# Altium schematic symbol library Regulator_Linear.SchLib: 1452 symbols (part 6 of 10) (continued)
## MCP1700-1802E_SOT89
designator *  value MCP1700-1802E_SOT89
ki_keywords: regulator linear ldo; ki_description: 250mA Low Quiscent Current LDO, 1.8V output, SOT-89; ki_fp_filters: SOT?89*; Footprint: Package_TO_SOT_SMD:SOT-89-3; Supplier: http://ww1.microchip.com/downloads/en/DeviceDoc/20001826D.pdf
footprint SOT-89-3
pins: 1 GND (power), 2 VI (power), 3 VO (power)

## MCP1700-1802E_TO92
designator *  value MCP1700-1802E_TO92
ki_keywords: regulator linear ldo; ki_description: 250mA Low Quiscent Current LDO, 1.8V output, TO-92; ki_fp_filters: TO?92*; Footprint: Package_TO_SOT_THT:TO-92_Inline; Supplier: http://ww1.microchip.com/downloads/en/DeviceDoc/20001826D.pdf
footprint TO-92_Inline
pins: 1 GND (power), 2 VI (power), 3 VO (power)

## MCP1700-2502E_SOT23
designator *  value MCP1700-2502E_SOT23
ki_keywords: regulator linear ldo; ki_description: 250mA Low Quiscent Current LDO, 2.5V output, SOT-23; ki_fp_filters: SOT?23*; Footprint: Package_TO_SOT_SMD:SOT-23; Supplier: http://ww1.microchip.com/downloads/en/DeviceDoc/20001826D.pdf
footprint SOT-23
pins: 1 GND (power), 2 VO (power), 3 VI (power)

## MCP1700-2502E_SOT89
designator *  value MCP1700-2502E_SOT89
ki_keywords: regulator linear ldo; ki_description: 250mA Low Quiscent Current LDO, 2.5V output, SOT-89; ki_fp_filters: SOT?89*; Footprint: Package_TO_SOT_SMD:SOT-89-3; Supplier: http://ww1.microchip.com/downloads/en/DeviceDoc/20001826D.pdf
footprint SOT-89-3
pins: 1 GND (power), 2 VI (power), 3 VO (power)

## MCP1700-2502E_TO92
designator *  value MCP1700-2502E_TO92
ki_keywords: regulator linear ldo; ki_description: 250mA Low Quiscent Current LDO, 2.5V output, TO-92; ki_fp_filters: TO?92*; Footprint: Package_TO_SOT_THT:TO-92_Inline; Supplier: http://ww1.microchip.com/downloads/en/DeviceDoc/20001826D.pdf
footprint TO-92_Inline
pins: 1 GND (power), 2 VI (power), 3 VO (power)

## MCP1700-2802E_SOT23
designator *  value MCP1700-2802E_SOT23
ki_keywords: regulator linear ldo; ki_description: 250mA Low Quiscent Current LDO, 2.8V output, SOT-23; ki_fp_filters: SOT?23*; Footprint: Package_TO_SOT_SMD:SOT-23; Supplier: http://ww1.microchip.com/downloads/en/DeviceDoc/20001826D.pdf
footprint SOT-23
pins: 1 GND (power), 2 VO (power), 3 VI (power)

## MCP1700-2802E_SOT89
designator *  value MCP1700-2802E_SOT89
ki_keywords: regulator linear ldo; ki_description: 250mA Low Quiscent Current LDO, 2.8V output, SOT-89; ki_fp_filters: SOT?89*; Footprint: Package_TO_SOT_SMD:SOT-89-3; Supplier: http://ww1.microchip.com/downloads/en/DeviceDoc/20001826D.pdf
footprint SOT-89-3
pins: 1 GND (power), 2 VI (power), 3 VO (power)

## MCP1700-2802E_TO92
designator *  value MCP1700-2802E_TO92
ki_keywords: regulator linear ldo; ki_description: 250mA Low Quiscent Current LDO, 2.8V output, TO-92; ki_fp_filters: TO?92*; Footprint: Package_TO_SOT_THT:TO-92_Inline; Supplier: http://ww1.microchip.com/downloads/en/DeviceDoc/20001826D.pdf
footprint TO-92_Inline
pins: 1 GND (power), 2 VI (power), 3 VO (power)

## MCP1700-3002E_SOT23
designator *  value MCP1700-3002E_SOT23
ki_keywords: regulator linear ldo; ki_description: 250mA Low Quiscent Current LDO, 3.0V output, SOT-23; ki_fp_filters: SOT?23*; Footprint: Package_TO_SOT_SMD:SOT-23; Supplier: http://ww1.microchip.com/downloads/en/DeviceDoc/20001826D.pdf
footprint SOT-23
pins: 1 GND (power), 2 VO (power), 3 VI (power)

## MCP1700-3002E_SOT89
designator *  value MCP1700-3002E_SOT89
ki_keywords: regulator linear ldo; ki_description: 250mA Low Quiscent Current LDO, 3.0V output, SOT-89; ki_fp_filters: SOT?89*; Footprint: Package_TO_SOT_SMD:SOT-89-3; Supplier: http://ww1.microchip.com/downloads/en/DeviceDoc/20001826D.pdf
footprint SOT-89-3
pins: 1 GND (power), 2 VI (power), 3 VO (power)

## MCP1700-3002E_TO92
designator *  value MCP1700-3002E_TO92
ki_keywords: regulator linear ldo; ki_description: 250mA Low Quiscent Current LDO, 3.0V output, TO-92; ki_fp_filters: TO?92*; Footprint: Package_TO_SOT_THT:TO-92_Inline; Supplier: http://ww1.microchip.com/downloads/en/DeviceDoc/20001826D.pdf
footprint TO-92_Inline
pins: 1 GND (power), 2 VI (power), 3 VO (power)

## MCP1700-3302E_SOT23
designator *  value MCP1700-3302E_SOT23
ki_keywords: regulator linear ldo; ki_description: 250mA Low Quiscent Current LDO, 3.3V output, SOT-23; ki_fp_filters: SOT?23*; Footprint: Package_TO_SOT_SMD:SOT-23; Supplier: http://ww1.microchip.com/downloads/en/DeviceDoc/20001826D.pdf
footprint SOT-23
pins: 1 GND (power), 2 VO (power), 3 VI (power)

## MCP1700-3302E_SOT89
designator *  value MCP1700-3302E_SOT89
ki_keywords: regulator linear ldo; ki_description: 250mA Low Quiscent Current LDO, 3.3V output, SOT-89; ki_fp_filters: SOT?89*; Footprint: Package_TO_SOT_SMD:SOT-89-3; Supplier: http://ww1.microchip.com/downloads/en/DeviceDoc/20001826D.pdf
footprint SOT-89-3
pins: 1 GND (power), 2 VI (power), 3 VO (power)

## MCP1700-3302E_TO92
designator *  value MCP1700-3302E_TO92
ki_keywords: regulator linear ldo; ki_description: 250mA Low Quiscent Current LDO, 3.3V output, TO-92; ki_fp_filters: TO?92*; Footprint: Package_TO_SOT_THT:TO-92_Inline; Supplier: http://ww1.microchip.com/downloads/en/DeviceDoc/20001826D.pdf
footprint TO-92_Inline
pins: 1 GND (power), 2 VI (power), 3 VO (power)

## MCP1700-5002E_SOT23
designator *  value MCP1700-5002E_SOT23
ki_keywords: regulator linear ldo; ki_description: 250mA Low Quiscent Current LDO, 5.0V output, SOT-23; ki_fp_filters: SOT?23*; Footprint: Package_TO_SOT_SMD:SOT-23; Supplier: http://ww1.microchip.com/downloads/en/DeviceDoc/20001826D.pdf
footprint SOT-23
pins: 1 GND (power), 2 VO (power), 3 VI (power)

## MCP1700-5002E_SOT89
designator *  value MCP1700-5002E_SOT89
ki_keywords: regulator linear ldo; ki_description: 250mA Low Quiscent Current LDO, 5.0V output, SOT-89; ki_fp_filters: SOT?89*; Footprint: Package_TO_SOT_SMD:SOT-89-3; Supplier: http://ww1.microchip.com/downloads/en/DeviceDoc/20001826D.pdf
footprint SOT-89-3
pins: 1 GND (power), 2 VI (power), 3 VO (power)

## MCP1700-5002E_TO92
designator *  value MCP1700-5002E_TO92
ki_keywords: regulator linear ldo; ki_description: 250mA Low Quiscent Current LDO, 5.0V output, TO-92; ki_fp_filters: TO?92*; Footprint: Package_TO_SOT_THT:TO-92_Inline; Supplier: http://ww1.microchip.com/downloads/en/DeviceDoc/20001826D.pdf
footprint TO-92_Inline
pins: 1 GND (power), 2 VI (power), 3 VO (power)

## MCP1703A-1202_SOT23
designator *  value MCP1703A-1202_SOT23
ki_keywords: REGULATOR LDO; ki_description: Low Quiescent Current LDO Regulator, 1.2V, 250mA, Vin<=16V, SOT-23; ki_fp_filters: SOT?23*; Footprint: Package_TO_SOT_SMD:SOT-23; Supplier: http://ww1.microchip.com/downloads/en/DeviceDoc/20005122B.pdf
footprint SOT-23
pins: 1 GND (power), 2 VO (power), 3 VI (power)

## MCP1703A-1202_SOT89
designator *  value MCP1703A-1202_SOT89
ki_keywords: REGULATOR LDO; ki_description: Low Quiescent Current LDO Regulator, 1.2V, 250mA, Vin<=16V, SOT-89; ki_fp_filters: SOT?89*; Footprint: Package_TO_SOT_SMD:SOT-89-3; Supplier: http://ww1.microchip.com/downloads/en/DeviceDoc/20005122B.pdf
footprint SOT-89-3
pins: 1 GND (power), 2 VI (power), 3 VO (power)

## MCP1703A-1202_SOT223
designator *  value MCP1703A-1202_SOT223
ki_keywords: REGULATOR LDO; ki_description: Low Quiescent Current LDO Regulator, 1.2V, 250mA, Vin<=16V, SOT-223; ki_fp_filters: SOT?223*TabPin2*; Footprint: Package_TO_SOT_SMD:SOT-223-3_TabPin2; Supplier: http://ww1.microchip.com/downloads/en/DeviceDoc/20005122B.pdf
footprint SOT-223-3_TabPin2
pins: 1 VI (power), 2 GND (power), 3 VO (power)

## MCP1703A-1502_SOT23
designator *  value MCP1703A-1502_SOT23
ki_keywords: REGULATOR LDO; ki_description: Low Quiescent Current LDO Regulator, 1.5V, 250mA, Vin<=16V, SOT-23; ki_fp_filters: SOT?23*; Footprint: Package_TO_SOT_SMD:SOT-23; Supplier: http://ww1.microchip.com/downloads/en/DeviceDoc/20005122B.pdf
footprint SOT-23
pins: 1 GND (power), 2 VO (power), 3 VI (power)

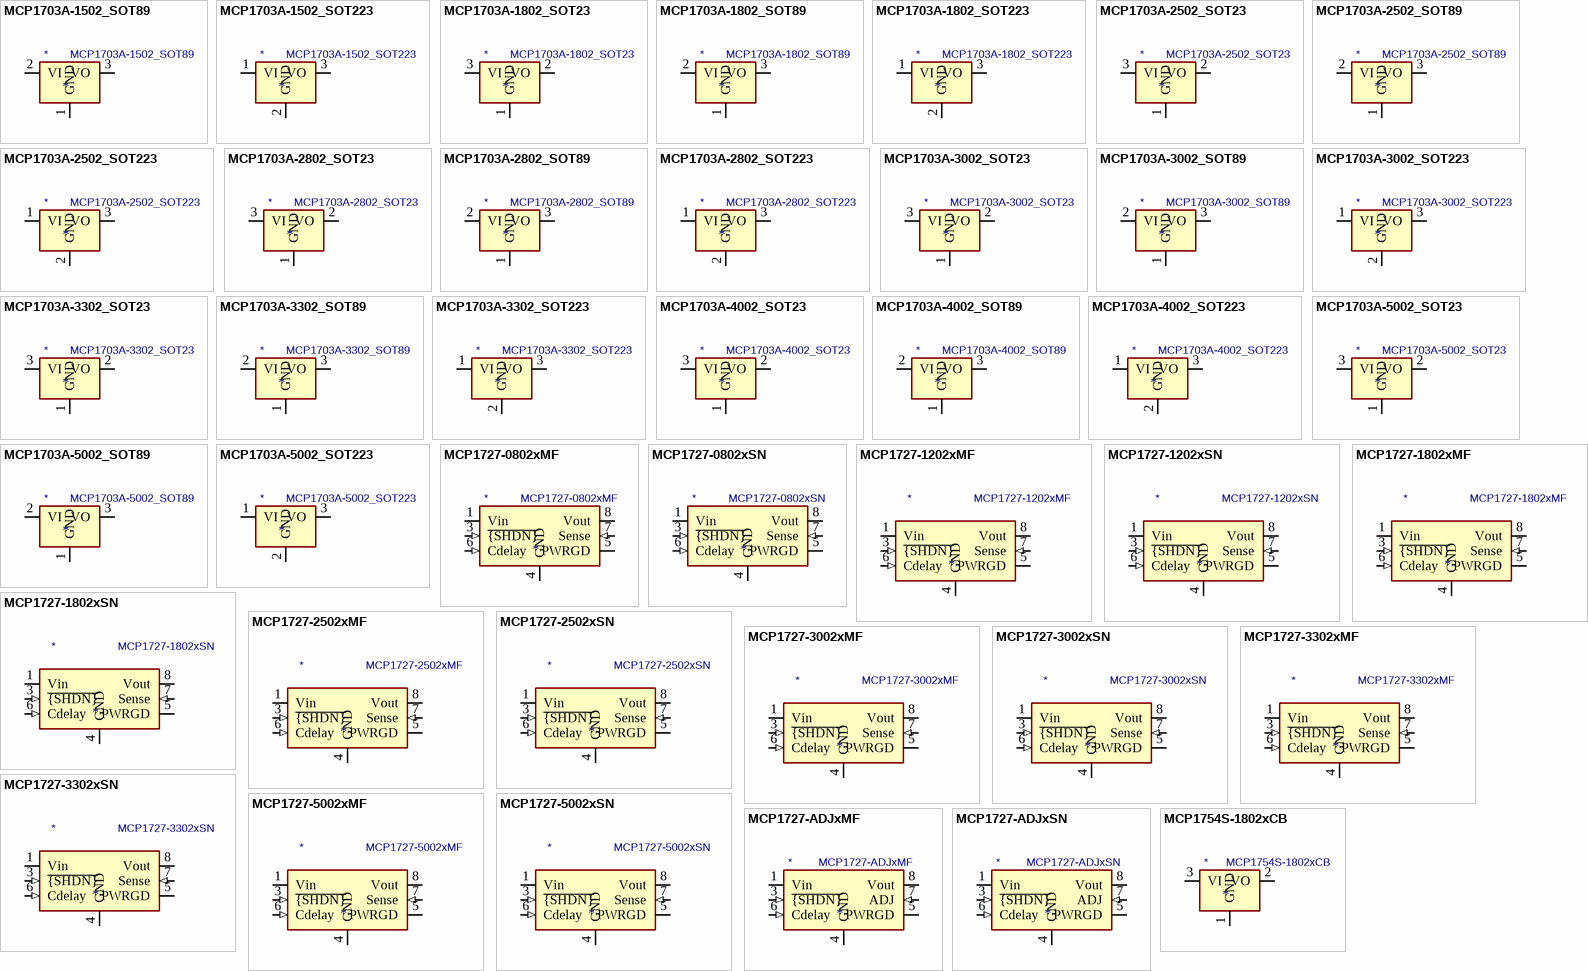
[diagram p22: symbols MCP1703A-1502_SOT89 to MCP1754S-1802xCB]

## MCP1703A-1502_SOT89
designator *  value MCP1703A-1502_SOT89
ki_keywords: REGULATOR LDO; ki_description: Low Quiescent Current LDO Regulator, 1.5V, 250mA, Vin<=16V, SOT-89; ki_fp_filters: SOT?89*; Footprint: Package_TO_SOT_SMD:SOT-89-3; Supplier: http://ww1.microchip.com/downloads/en/DeviceDoc/20005122B.pdf
footprint SOT-89-3
pins: 1 GND (power), 2 VI (power), 3 VO (power)

## MCP1703A-1502_SOT223
designator *  value MCP1703A-1502_SOT223
ki_keywords: REGULATOR LDO; ki_description: Low Quiescent Current LDO Regulator, 1.5V, 250mA, Vin<=16V, SOT-223; ki_fp_filters: SOT?223*TabPin2*; Footprint: Package_TO_SOT_SMD:SOT-223-3_TabPin2; Supplier: http://ww1.microchip.com/downloads/en/DeviceDoc/20005122B.pdf
footprint SOT-223-3_TabPin2
pins: 1 VI (power), 2 GND (power), 3 VO (power)

## MCP1703A-1802_SOT23
designator *  value MCP1703A-1802_SOT23
ki_keywords: REGULATOR LDO; ki_description: Low Quiescent Current LDO Regulator, 1.8V, 250mA, Vin<=16V, SOT-23; ki_fp_filters: SOT?23*; Footprint: Package_TO_SOT_SMD:SOT-23; Supplier: http://ww1.microchip.com/downloads/en/DeviceDoc/20005122B.pdf
footprint SOT-23
pins: 1 GND (power), 2 VO (power), 3 VI (power)

## MCP1703A-1802_SOT89
designator *  value MCP1703A-1802_SOT89
ki_keywords: REGULATOR LDO; ki_description: Low Quiescent Current LDO Regulator, 1.8V, 250mA, Vin<=16V, SOT-89; ki_fp_filters: SOT?89*; Footprint: Package_TO_SOT_SMD:SOT-89-3; Supplier: http://ww1.microchip.com/downloads/en/DeviceDoc/20005122B.pdf
footprint SOT-89-3
pins: 1 GND (power), 2 VI (power), 3 VO (power)

## MCP1703A-1802_SOT223
designator *  value MCP1703A-1802_SOT223
ki_keywords: REGULATOR LDO; ki_description: Low Quiescent Current LDO Regulator, 1.8V, 250mA, Vin<=16V, SOT-223; ki_fp_filters: SOT?223*TabPin2*; Footprint: Package_TO_SOT_SMD:SOT-223-3_TabPin2; Supplier: http://ww1.microchip.com/downloads/en/DeviceDoc/20005122B.pdf
footprint SOT-223-3_TabPin2
pins: 1 VI (power), 2 GND (power), 3 VO (power)

## MCP1703A-2502_SOT23
designator *  value MCP1703A-2502_SOT23
ki_keywords: REGULATOR LDO; ki_description: Low Quiescent Current LDO Regulator, 2.5V, 250mA, Vin<=16V, SOT-23; ki_fp_filters: SOT?23*; Footprint: Package_TO_SOT_SMD:SOT-23; Supplier: http://ww1.microchip.com/downloads/en/DeviceDoc/20005122B.pdf
footprint SOT-23
pins: 1 GND (power), 2 VO (power), 3 VI (power)

## MCP1703A-2502_SOT89
designator *  value MCP1703A-2502_SOT89
ki_keywords: REGULATOR LDO; ki_description: Low Quiescent Current LDO Regulator, 2.5V, 250mA, Vin<=16V, SOT-89; ki_fp_filters: SOT?89*; Footprint: Package_TO_SOT_SMD:SOT-89-3; Supplier: http://ww1.microchip.com/downloads/en/DeviceDoc/20005122B.pdf
footprint SOT-89-3
pins: 1 GND (power), 2 VI (power), 3 VO (power)

## MCP1703A-2502_SOT223
designator *  value MCP1703A-2502_SOT223
ki_keywords: REGULATOR LDO; ki_description: Low Quiescent Current LDO Regulator, 2.5V, 250mA, Vin<=16V, SOT-223; ki_fp_filters: SOT?223*TabPin2*; Footprint: Package_TO_SOT_SMD:SOT-223-3_TabPin2; Supplier: http://ww1.microchip.com/downloads/en/DeviceDoc/20005122B.pdf
footprint SOT-223-3_TabPin2
pins: 1 VI (power), 2 GND (power), 3 VO (power)

## MCP1703A-2802_SOT23
designator *  value MCP1703A-2802_SOT23
ki_keywords: REGULATOR LDO; ki_description: Low Quiescent Current LDO Regulator, 2.8V, 250mA, Vin<=16V, SOT-23; ki_fp_filters: SOT?23*; Footprint: Package_TO_SOT_SMD:SOT-23; Supplier: http://ww1.microchip.com/downloads/en/DeviceDoc/20005122B.pdf
footprint SOT-23
pins: 1 GND (power), 2 VO (power), 3 VI (power)

## MCP1703A-2802_SOT89
designator *  value MCP1703A-2802_SOT89
ki_keywords: REGULATOR LDO; ki_description: Low Quiescent Current LDO Regulator, 2.8V, 250mA, Vin<=16V, SOT-89; ki_fp_filters: SOT?89*; Footprint: Package_TO_SOT_SMD:SOT-89-3; Supplier: http://ww1.microchip.com/downloads/en/DeviceDoc/20005122B.pdf
footprint SOT-89-3
pins: 1 GND (power), 2 VI (power), 3 VO (power)

## MCP1703A-2802_SOT223
designator *  value MCP1703A-2802_SOT223
ki_keywords: REGULATOR LDO; ki_description: Low Quiescent Current LDO Regulator, 2.8V, 250mA, Vin<=16V, SOT-223; ki_fp_filters: SOT?223*TabPin2*; Footprint: Package_TO_SOT_SMD:SOT-223-3_TabPin2; Supplier: http://ww1.microchip.com/downloads/en/DeviceDoc/20005122B.pdf
footprint SOT-223-3_TabPin2
pins: 1 VI (power), 2 GND (power), 3 VO (power)

## MCP1703A-3002_SOT23
designator *  value MCP1703A-3002_SOT23
ki_keywords: REGULATOR LDO; ki_description: Low Quiescent Current LDO Regulator, 3.0V, 250mA, Vin<=16V, SOT-23; ki_fp_filters: SOT?23*; Footprint: Package_TO_SOT_SMD:SOT-23; Supplier: http://ww1.microchip.com/downloads/en/DeviceDoc/20005122B.pdf
footprint SOT-23
pins: 1 GND (power), 2 VO (power), 3 VI (power)

## MCP1703A-3002_SOT89
designator *  value MCP1703A-3002_SOT89
ki_keywords: REGULATOR LDO; ki_description: Low Quiescent Current LDO Regulator, 3.0V, 250mA, Vin<=16V, SOT-89; ki_fp_filters: SOT?89*; Footprint: Package_TO_SOT_SMD:SOT-89-3; Supplier: http://ww1.microchip.com/downloads/en/DeviceDoc/20005122B.pdf
footprint SOT-89-3
pins: 1 GND (power), 2 VI (power), 3 VO (power)

## MCP1703A-3002_SOT223
designator *  value MCP1703A-3002_SOT223
ki_keywords: REGULATOR LDO; ki_description: Low Quiescent Current LDO Regulator, 3.0V, 250mA, Vin<=16V, SOT-223; ki_fp_filters: SOT?223*TabPin2*; Footprint: Package_TO_SOT_SMD:SOT-223-3_TabPin2; Supplier: http://ww1.microchip.com/downloads/en/DeviceDoc/20005122B.pdf
footprint SOT-223-3_TabPin2
pins: 1 VI (power), 2 GND (power), 3 VO (power)

## MCP1703A-3302_SOT23
designator *  value MCP1703A-3302_SOT23
ki_keywords: REGULATOR LDO; ki_description: Low Quiescent Current LDO Regulator, 3.3V, 250mA, Vin<=16V, SOT-23; ki_fp_filters: SOT?23*; Footprint: Package_TO_SOT_SMD:SOT-23; Supplier: http://ww1.microchip.com/downloads/en/DeviceDoc/20005122B.pdf
footprint SOT-23
pins: 1 GND (power), 2 VO (power), 3 VI (power)

## MCP1703A-3302_SOT89
designator *  value MCP1703A-3302_SOT89
ki_keywords: REGULATOR LDO; ki_description: Low Quiescent Current LDO Regulator, 3.3V, 250mA, Vin<=16V, SOT-89; ki_fp_filters: SOT?89*; Footprint: Package_TO_SOT_SMD:SOT-89-3; Supplier: http://ww1.microchip.com/downloads/en/DeviceDoc/20005122B.pdf
footprint SOT-89-3
pins: 1 GND (power), 2 VI (power), 3 VO (power)

## MCP1703A-3302_SOT223
designator *  value MCP1703A-3302_SOT223
ki_keywords: REGULATOR LDO; ki_description: Low Quiescent Current LDO Regulator, 3.3V, 250mA, Vin<=16V, SOT-223; ki_fp_filters: SOT?223*TabPin2*; Footprint: Package_TO_SOT_SMD:SOT-223-3_TabPin2; Supplier: http://ww1.microchip.com/downloads/en/DeviceDoc/20005122B.pdf
footprint SOT-223-3_TabPin2
pins: 1 VI (power), 2 GND (power), 3 VO (power)

## MCP1703A-4002_SOT23
designator *  value MCP1703A-4002_SOT23
ki_keywords: REGULATOR LDO; ki_description: Low Quiescent Current LDO Regulator, 4.0V, 250mA, Vin<=16V, SOT-23; ki_fp_filters: SOT?23*; Footprint: Package_TO_SOT_SMD:SOT-23; Supplier: http://ww1.microchip.com/downloads/en/DeviceDoc/20005122B.pdf
footprint SOT-23
pins: 1 GND (power), 2 VO (power), 3 VI (power)

## MCP1703A-4002_SOT89
designator *  value MCP1703A-4002_SOT89
ki_keywords: REGULATOR LDO; ki_description: Low Quiescent Current LDO Regulator, 4.0V, 250mA, Vin<=16V, SOT-89; ki_fp_filters: SOT?89*; Footprint: Package_TO_SOT_SMD:SOT-89-3; Supplier: http://ww1.microchip.com/downloads/en/DeviceDoc/20005122B.pdf
footprint SOT-89-3
pins: 1 GND (power), 2 VI (power), 3 VO (power)

## MCP1703A-4002_SOT223
designator *  value MCP1703A-4002_SOT223
ki_keywords: REGULATOR LDO; ki_description: Low Quiescent Current LDO Regulator, 4.0V, 250mA, Vin<=16V, SOT-223; ki_fp_filters: SOT?223*TabPin2*; Footprint: Package_TO_SOT_SMD:SOT-223-3_TabPin2; Supplier: http://ww1.microchip.com/downloads/en/DeviceDoc/20005122B.pdf
footprint SOT-223-3_TabPin2
pins: 1 VI (power), 2 GND (power), 3 VO (power)

## MCP1703A-5002_SOT23
designator *  value MCP1703A-5002_SOT23
ki_keywords: REGULATOR LDO; ki_description: Low Quiescent Current LDO Regulator, 5.0V, 250mA, Vin<=16V, SOT-23; ki_fp_filters: SOT?23*; Footprint: Package_TO_SOT_SMD:SOT-23; Supplier: http://ww1.microchip.com/downloads/en/DeviceDoc/20005122B.pdf
footprint SOT-23
pins: 1 GND (power), 2 VO (power), 3 VI (power)

## MCP1703A-5002_SOT89
designator *  value MCP1703A-5002_SOT89
ki_keywords: REGULATOR LDO; ki_description: Low Quiescent Current LDO Regulator, 5.0V, 250mA, Vin<=16V, SOT-89; ki_fp_filters: SOT?89*; Footprint: Package_TO_SOT_SMD:SOT-89-3; Supplier: http://ww1.microchip.com/downloads/en/DeviceDoc/20005122B.pdf
footprint SOT-89-3
pins: 1 GND (power), 2 VI (power), 3 VO (power)

## MCP1703A-5002_SOT223
designator *  value MCP1703A-5002_SOT223
ki_keywords: REGULATOR LDO; ki_description: Low Quiescent Current LDO Regulator, 5.0V, 250mA, Vin<=16V, SOT-223; ki_fp_filters: SOT?223*TabPin2*; Footprint: Package_TO_SOT_SMD:SOT-223-3_TabPin2; Supplier: http://ww1.microchip.com/downloads/en/DeviceDoc/20005122B.pdf
footprint SOT-223-3_TabPin2
pins: 1 VI (power), 2 GND (power), 3 VO (power)

## MCP1727-0802xMF
designator *  value MCP1727-0802xMF
ki_keywords: Low Voltage Low Quiescent Current Fixed LDO Regulator; ki_description: 1.5A, Low Voltage, Low Quiescent Current LDO Regulator, 2.3 - 6V Input, Fixed 0.8V Output, 330mV Dropout, DFN-8; ki_fp_filters: DFN*3x3mm*P0.65mm*; Footprint: Package_DFN_QFN:DFN-8-1EP_3x3mm_P0.65mm_EP1.55x2.4mm; Supplier: https://ww1.microchip.com/downloads/aemtest/APID/ProductDocuments/DataSheets/MCP1727-1.5A-Low-Voltage-Low-Quiescent-Current-LDO-Regulator-20001999D.pdf
footprint DFN-8-1EP_3x3mm_P0.65mm_EP1.55x2.4mm
pins: 1 Vin (power), 2 Vin hidden, 3 ~{{SHDN}} (in), 4 GND (power), 5 PWRGD (oc), 6 Cdelay (in), 7 Sense (in), 8 Vout (power), 9 GND hidden

## MCP1727-0802xSN
designator *  value MCP1727-0802xSN
ki_keywords: Low Voltage Low Quiescent Current Fixed LDO Regulator; ki_description: 1.5A, Low Voltage, Low Quiescent Current LDO Regulator, 2.3 - 6V Input, Fixed 0.8V Output, 330mV Dropout, SOIC-8; ki_fp_filters: SOIC*3.9x4.9mm*P1.27mm*; Footprint: Package_SO:SOIC-8_3.9x4.9mm_P1.27mm; Supplier: https://ww1.microchip.com/downloads/aemtest/APID/ProductDocuments/DataSheets/MCP1727-1.5A-Low-Voltage-Low-Quiescent-Current-LDO-Regulator-20001999D.pdf
footprint SOIC-8_3.9x4.9mm_P1.27mm
pins: 1 Vin (power), 2 Vin hidden, 3 ~{{SHDN}} (in), 4 GND (power), 5 PWRGD (oc), 6 Cdelay (in), 7 Sense (in), 8 Vout (power)

## MCP1727-1202xMF
designator *  value MCP1727-1202xMF
ki_keywords: Low Voltage Low Quiescent Current Fixed LDO Regulator; ki_description: 1.5A, Low Voltage, Low Quiescent Current LDO Regulator, 2.3 - 6V Input, Fixed 1.2V Output, 330mV Dropout, DFN-8; ki_fp_filters: DFN*3x3mm*P0.65mm*; Footprint: Package_DFN_QFN:DFN-8-1EP_3x3mm_P0.65mm_EP1.55x2.4mm; Supplier: https://ww1.microchip.com/downloads/aemtest/APID/ProductDocuments/DataSheets/MCP1727-1.5A-Low-Voltage-Low-Quiescent-Current-LDO-Regulator-20001999D.pdf
footprint DFN-8-1EP_3x3mm_P0.65mm_EP1.55x2.4mm
pins: 1 Vin (power), 2 Vin hidden, 3 ~{{SHDN}} (in), 4 GND (power), 5 PWRGD (oc), 6 Cdelay (in), 7 Sense (in), 8 Vout (power), 9 GND hidden

## MCP1727-1202xSN
designator *  value MCP1727-1202xSN
ki_keywords: Low Voltage Low Quiescent Current Fixed LDO Regulator; ki_description: 1.5A, Low Voltage, Low Quiescent Current LDO Regulator, 2.3 - 6V Input, Fixed 1.2V Output, 330mV Dropout, SOIC-8; ki_fp_filters: SOIC*3.9x4.9mm*P1.27mm*; Footprint: Package_SO:SOIC-8_3.9x4.9mm_P1.27mm; Supplier: https://ww1.microchip.com/downloads/aemtest/APID/ProductDocuments/DataSheets/MCP1727-1.5A-Low-Voltage-Low-Quiescent-Current-LDO-Regulator-20001999D.pdf
footprint SOIC-8_3.9x4.9mm_P1.27mm
pins: 1 Vin (power), 2 Vin hidden, 3 ~{{SHDN}} (in), 4 GND (power), 5 PWRGD (oc), 6 Cdelay (in), 7 Sense (in), 8 Vout (power)

## MCP1727-1802xMF
designator *  value MCP1727-1802xMF
ki_keywords: Low Voltage Low Quiescent Current Fixed LDO Regulator; ki_description: 1.5A, Low Voltage, Low Quiescent Current LDO Regulator, 2.3 - 6V Input, Fixed 1.8V Output, 330mV Dropout, DFN-8; ki_fp_filters: DFN*3x3mm*P0.65mm*; Footprint: Package_DFN_QFN:DFN-8-1EP_3x3mm_P0.65mm_EP1.55x2.4mm; Supplier: https://ww1.microchip.com/downloads/aemtest/APID/ProductDocuments/DataSheets/MCP1727-1.5A-Low-Voltage-Low-Quiescent-Current-LDO-Regulator-20001999D.pdf
footprint DFN-8-1EP_3x3mm_P0.65mm_EP1.55x2.4mm
pins: 1 Vin (power), 2 Vin hidden, 3 ~{{SHDN}} (in), 4 GND (power), 5 PWRGD (oc), 6 Cdelay (in), 7 Sense (in), 8 Vout (power), 9 GND hidden

## MCP1727-1802xSN
designator *  value MCP1727-1802xSN
ki_keywords: Low Voltage Low Quiescent Current Fixed LDO Regulator; ki_description: 1.5A, Low Voltage, Low Quiescent Current LDO Regulator, 2.3 - 6V Input, Fixed 1.8V Output, 330mV Dropout, SOIC-8; ki_fp_filters: SOIC*3.9x4.9mm*P1.27mm*; Footprint: Package_SO:SOIC-8_3.9x4.9mm_P1.27mm; Supplier: https://ww1.microchip.com/downloads/aemtest/APID/ProductDocuments/DataSheets/MCP1727-1.5A-Low-Voltage-Low-Quiescent-Current-LDO-Regulator-20001999D.pdf
footprint SOIC-8_3.9x4.9mm_P1.27mm
pins: 1 Vin (power), 2 Vin hidden, 3 ~{{SHDN}} (in), 4 GND (power), 5 PWRGD (oc), 6 Cdelay (in), 7 Sense (in), 8 Vout (power)

## MCP1727-2502xMF
designator *  value MCP1727-2502xMF
ki_keywords: Low Voltage Low Quiescent Current Fixed LDO Regulator; ki_description: 1.5A, Low Voltage, Low Quiescent Current LDO Regulator, 2.3 - 6V Input, Fixed 2.5V Output, 330mV Dropout, DFN-8; ki_fp_filters: DFN*3x3mm*P0.65mm*; Footprint: Package_DFN_QFN:DFN-8-1EP_3x3mm_P0.65mm_EP1.55x2.4mm; Supplier: https://ww1.microchip.com/downloads/aemtest/APID/ProductDocuments/DataSheets/MCP1727-1.5A-Low-Voltage-Low-Quiescent-Current-LDO-Regulator-20001999D.pdf
footprint DFN-8-1EP_3x3mm_P0.65mm_EP1.55x2.4mm
pins: 1 Vin (power), 2 Vin hidden, 3 ~{{SHDN}} (in), 4 GND (power), 5 PWRGD (oc), 6 Cdelay (in), 7 Sense (in), 8 Vout (power), 9 GND hidden

## MCP1727-2502xSN
designator *  value MCP1727-2502xSN
ki_keywords: Low Voltage Low Quiescent Current Fixed LDO Regulator; ki_description: 1.5A, Low Voltage, Low Quiescent Current LDO Regulator, 2.3 - 6V Input, Fixed 2.5V Output, 330mV Dropout, SOIC-8; ki_fp_filters: SOIC*3.9x4.9mm*P1.27mm*; Footprint: Package_SO:SOIC-8_3.9x4.9mm_P1.27mm; Supplier: https://ww1.microchip.com/downloads/aemtest/APID/ProductDocuments/DataSheets/MCP1727-1.5A-Low-Voltage-Low-Quiescent-Current-LDO-Regulator-20001999D.pdf
footprint SOIC-8_3.9x4.9mm_P1.27mm
pins: 1 Vin (power), 2 Vin hidden, 3 ~{{SHDN}} (in), 4 GND (power), 5 PWRGD (oc), 6 Cdelay (in), 7 Sense (in), 8 Vout (power)

## MCP1727-3002xMF
designator *  value MCP1727-3002xMF
ki_keywords: Low Voltage Low Quiescent Current Fixed LDO Regulator; ki_description: 1.5A, Low Voltage, Low Quiescent Current LDO Regulator, 2.3 - 6V Input, Fixed 3.0V Output, 330mV Dropout, DFN-8; ki_fp_filters: DFN*3x3mm*P0.65mm*; Footprint: Package_DFN_QFN:DFN-8-1EP_3x3mm_P0.65mm_EP1.55x2.4mm; Supplier: https://ww1.microchip.com/downloads/aemtest/APID/ProductDocuments/DataSheets/MCP1727-1.5A-Low-Voltage-Low-Quiescent-Current-LDO-Regulator-20001999D.pdf
footprint DFN-8-1EP_3x3mm_P0.65mm_EP1.55x2.4mm
pins: 1 Vin (power), 2 Vin hidden, 3 ~{{SHDN}} (in), 4 GND (power), 5 PWRGD (oc), 6 Cdelay (in), 7 Sense (in), 8 Vout (power), 9 GND hidden

## MCP1727-3002xSN
designator *  value MCP1727-3002xSN
ki_keywords: Low Voltage Low Quiescent Current Fixed LDO Regulator; ki_description: 1.5A, Low Voltage, Low Quiescent Current LDO Regulator, 2.3 - 6V Input, Fixed 3.0V Output, 330mV Dropout, SOIC-8; ki_fp_filters: SOIC*3.9x4.9mm*P1.27mm*; Footprint: Package_SO:SOIC-8_3.9x4.9mm_P1.27mm; Supplier: https://ww1.microchip.com/downloads/aemtest/APID/ProductDocuments/DataSheets/MCP1727-1.5A-Low-Voltage-Low-Quiescent-Current-LDO-Regulator-20001999D.pdf
footprint SOIC-8_3.9x4.9mm_P1.27mm
pins: 1 Vin (power), 2 Vin hidden, 3 ~{{SHDN}} (in), 4 GND (power), 5 PWRGD (oc), 6 Cdelay (in), 7 Sense (in), 8 Vout (power)

## MCP1727-3302xMF
designator *  value MCP1727-3302xMF
ki_keywords: Low Voltage Low Quiescent Current Fixed LDO Regulator; ki_description: 1.5A, Low Voltage, Low Quiescent Current LDO Regulator, 2.3 - 6V Input, Fixed 3.3V Output, 330mV Dropout, DFN-8; ki_fp_filters: DFN*3x3mm*P0.65mm*; Footprint: Package_DFN_QFN:DFN-8-1EP_3x3mm_P0.65mm_EP1.55x2.4mm; Supplier: https://ww1.microchip.com/downloads/aemtest/APID/ProductDocuments/DataSheets/MCP1727-1.5A-Low-Voltage-Low-Quiescent-Current-LDO-Regulator-20001999D.pdf
footprint DFN-8-1EP_3x3mm_P0.65mm_EP1.55x2.4mm
pins: 1 Vin (power), 2 Vin hidden, 3 ~{{SHDN}} (in), 4 GND (power), 5 PWRGD (oc), 6 Cdelay (in), 7 Sense (in), 8 Vout (power), 9 GND hidden

## MCP1727-3302xSN
designator *  value MCP1727-3302xSN
ki_keywords: Low Voltage Low Quiescent Current Fixed LDO Regulator; ki_description: 1.5A, Low Voltage, Low Quiescent Current LDO Regulator, 2.3 - 6V Input, Fixed 3.3V Output, 330mV Dropout, SOIC-8; ki_fp_filters: SOIC*3.9x4.9mm*P1.27mm*; Footprint: Package_SO:SOIC-8_3.9x4.9mm_P1.27mm; Supplier: https://ww1.microchip.com/downloads/aemtest/APID/ProductDocuments/DataSheets/MCP1727-1.5A-Low-Voltage-Low-Quiescent-Current-LDO-Regulator-20001999D.pdf
footprint SOIC-8_3.9x4.9mm_P1.27mm
pins: 1 Vin (power), 2 Vin hidden, 3 ~{{SHDN}} (in), 4 GND (power), 5 PWRGD (oc), 6 Cdelay (in), 7 Sense (in), 8 Vout (power)

## MCP1727-5002xMF
designator *  value MCP1727-5002xMF
ki_keywords: Low Voltage Low Quiescent Current Fixed LDO Regulator; ki_description: 1.5A, Low Voltage, Low Quiescent Current LDO Regulator, 2.3 - 6V Input, Fixed 5.0V Output, 330mV Dropout, DFN-8; ki_fp_filters: DFN*3x3mm*P0.65mm*; Footprint: Package_DFN_QFN:DFN-8-1EP_3x3mm_P0.65mm_EP1.55x2.4mm; Supplier: https://ww1.microchip.com/downloads/aemtest/APID/ProductDocuments/DataSheets/MCP1727-1.5A-Low-Voltage-Low-Quiescent-Current-LDO-Regulator-20001999D.pdf
footprint DFN-8-1EP_3x3mm_P0.65mm_EP1.55x2.4mm
pins: 1 Vin (power), 2 Vin hidden, 3 ~{{SHDN}} (in), 4 GND (power), 5 PWRGD (oc), 6 Cdelay (in), 7 Sense (in), 8 Vout (power), 9 GND hidden

## MCP1727-5002xSN
designator *  value MCP1727-5002xSN
ki_keywords: Low Voltage Low Quiescent Current Fixed LDO Regulator; ki_description: 1.5A, Low Voltage, Low Quiescent Current LDO Regulator, 2.3 - 6V Input, Fixed 5.0V Output, 330mV Dropout, SOIC-8; ki_fp_filters: SOIC*3.9x4.9mm*P1.27mm*; Footprint: Package_SO:SOIC-8_3.9x4.9mm_P1.27mm; Supplier: https://ww1.microchip.com/downloads/aemtest/APID/ProductDocuments/DataSheets/MCP1727-1.5A-Low-Voltage-Low-Quiescent-Current-LDO-Regulator-20001999D.pdf
footprint SOIC-8_3.9x4.9mm_P1.27mm
pins: 1 Vin (power), 2 Vin hidden, 3 ~{{SHDN}} (in), 4 GND (power), 5 PWRGD (oc), 6 Cdelay (in), 7 Sense (in), 8 Vout (power)

## MCP1727-ADJxMF
designator *  value MCP1727-ADJxMF
ki_keywords: Low Voltage Low Quiescent Current Adjustable LDO Regulator; ki_description: 1.5A, Low Voltage, Low Quiescent Current LDO Regulator, 2.3 - 6V Input, Adjustable Output, 330mV Dropout, DFN-8; ki_fp_filters: DFN*3x3mm*P0.65mm*; Footprint: Package_DFN_QFN:DFN-8-1EP_3x3mm_P0.65mm_EP1.55x2.4mm; Supplier: https://ww1.microchip.com/downloads/aemtest/APID/ProductDocuments/DataSheets/MCP1727-1.5A-Low-Voltage-Low-Quiescent-Current-LDO-Regulator-20001999D.pdf
footprint DFN-8-1EP_3x3mm_P0.65mm_EP1.55x2.4mm
pins: 1 Vin (power), 2 Vin hidden, 3 ~{{SHDN}} (in), 4 GND (power), 5 PWRGD (oc), 6 Cdelay (in), 7 ADJ (in), 8 Vout (power), 9 GND hidden

## MCP1727-ADJxSN
designator *  value MCP1727-ADJxSN
ki_keywords: Low Voltage Low Quiescent Current Adjustable LDO Regulator; ki_description: 1.5A, Low Voltage, Low Quiescent Current LDO Regulator, 2.3 - 6V Input, Adjustable Output, 330mV Dropout, SOIC-8; ki_fp_filters: SOIC*3.9x4.9mm*P1.27mm*; Footprint: Package_SO:SOIC-8_3.9x4.9mm_P1.27mm; Supplier: https://ww1.microchip.com/downloads/aemtest/APID/ProductDocuments/DataSheets/MCP1727-1.5A-Low-Voltage-Low-Quiescent-Current-LDO-Regulator-20001999D.pdf
footprint SOIC-8_3.9x4.9mm_P1.27mm
pins: 1 Vin (power), 2 Vin hidden, 3 ~{{SHDN}} (in), 4 GND (power), 5 PWRGD (oc), 6 Cdelay (in), 7 ADJ (in), 8 Vout (power)

## MCP1754S-1802xCB
designator *  value MCP1754S-1802xCB
ki_keywords: Regulator LDO; ki_description: Fixed 150mA Low Dropout Voltage Regulator, Positive, 1.8V output, SOT-23; ki_fp_filters: SOT?23*; Footprint: Package_TO_SOT_SMD:SOT-23; Supplier: http://ww1.microchip.com/downloads/en/DeviceDoc/20002276C.pdf
footprint SOT-23
pins: 1 GND (power), 2 VO (power), 3 VI (power)

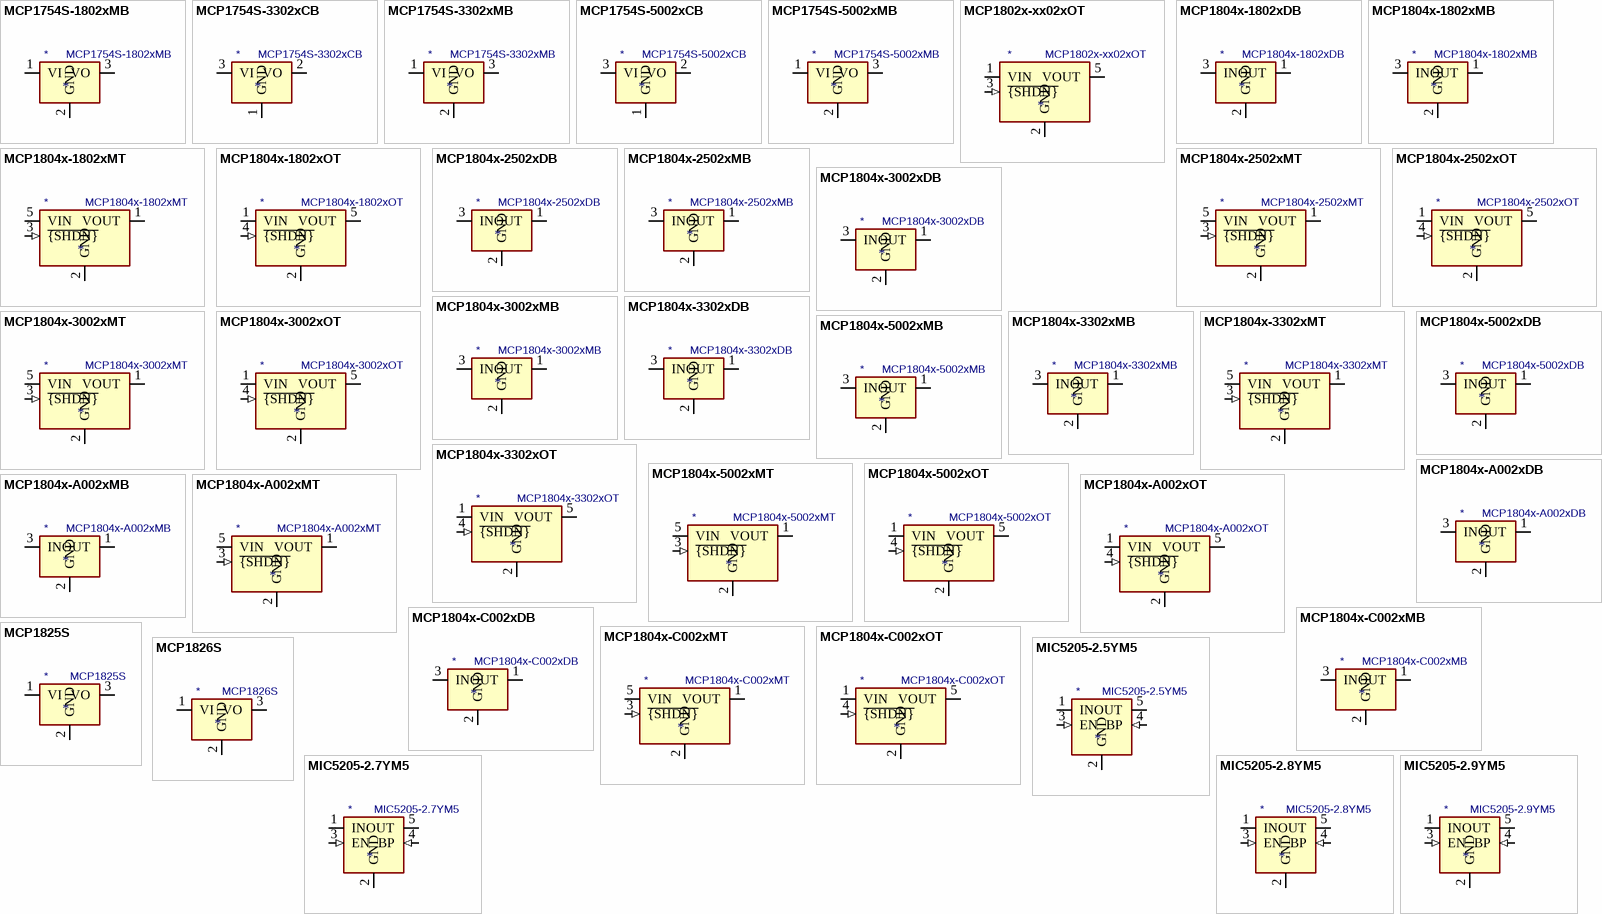
[diagram p23: symbols MCP1754S-1802xMB to MIC5205-2.9YM5]

## MCP1754S-1802xMB
designator *  value MCP1754S-1802xMB
ki_keywords: Regulator LDO; ki_description: Fixed 150mA Low Dropout Voltage Regulator, Positive, 1.8V output, SOT-89; ki_fp_filters: SOT?89*; Footprint: Package_TO_SOT_SMD:SOT-89-3; Supplier: http://ww1.microchip.com/downloads/en/DeviceDoc/20002276C.pdf
footprint SOT-89-3
pins: 1 VI (power), 2 GND (power), 3 VO (power)

## MCP1754S-3302xCB
designator *  value MCP1754S-3302xCB
ki_keywords: Regulator LDO; ki_description: Fixed 150mA Low Dropout Voltage Regulator, Positive, 3.3V output, SOT-23; ki_fp_filters: SOT?23*; Footprint: Package_TO_SOT_SMD:SOT-23; Supplier: http://ww1.microchip.com/downloads/en/DeviceDoc/20002276C.pdf
footprint SOT-23
pins: 1 GND (power), 2 VO (power), 3 VI (power)

## MCP1754S-3302xMB
designator *  value MCP1754S-3302xMB
ki_keywords: Regulator LDO; ki_description: Fixed 150mA Low Dropout Voltage Regulator, Positive, 3.3V output, SOT-89; ki_fp_filters: SOT?89*; Footprint: Package_TO_SOT_SMD:SOT-89-3; Supplier: http://ww1.microchip.com/downloads/en/DeviceDoc/20002276C.pdf
footprint SOT-89-3
pins: 1 VI (power), 2 GND (power), 3 VO (power)

## MCP1754S-5002xCB
designator *  value MCP1754S-5002xCB
ki_keywords: Regulator LDO; ki_description: Fixed 150mA Low Dropout Voltage Regulator, Positive, 5V output, SOT-23; ki_fp_filters: SOT?23*; Footprint: Package_TO_SOT_SMD:SOT-23; Supplier: http://ww1.microchip.com/downloads/en/DeviceDoc/20002276C.pdf
footprint SOT-23
pins: 1 GND (power), 2 VO (power), 3 VI (power)

## MCP1754S-5002xMB
designator *  value MCP1754S-5002xMB
ki_keywords: Regulator LDO; ki_description: Fixed 150mA Low Dropout Voltage Regulator, Positive, 5V output, SOT-89; ki_fp_filters: SOT?89*; Footprint: Package_TO_SOT_SMD:SOT-89-3; Supplier: http://ww1.microchip.com/downloads/en/DeviceDoc/20002276C.pdf
footprint SOT-89-3
pins: 1 VI (power), 2 GND (power), 3 VO (power)

## MCP1802x-xx02xOT
designator *  value MCP1802x-xx02xOT
ki_keywords: LDO Linear Voltage Regulator; ki_description: 150mA, Tiny CMOS LDO With Shutdown, Fixed Voltage, SOT-23-5; ki_fp_filters: SOT?23*; Footprint: Package_TO_SOT_SMD:SOT-23-5; Supplier: http://ww1.microchip.com/downloads/en/DeviceDoc/22053C.pdf
footprint SOT-23-5
pins: 1 VIN (power), 2 GND (power), 3 ~{{SHDN}} (in), 4 NC (in) hidden, 5 VOUT (power)

## MCP1804x-1802xDB
designator *  value MCP1804x-1802xDB
ki_keywords: linear regulator ldo fixed positive; ki_description: 150mA, 28V LDO Regulator With Shutdown, 1.8V Fixed Output, SOT-223; ki_fp_filters: SOT?223*; Footprint: Package_TO_SOT_SMD:SOT-223-3_TabPin2; Supplier: http://ww1.microchip.com/downloads/en/DeviceDoc/20002200D.pdf
footprint SOT-223-3_TabPin2
pins: 1 OUT (power), 2 GND (power), 3 IN (power)

## MCP1804x-1802xMB
designator *  value MCP1804x-1802xMB
ki_keywords: linear regulator ldo fixed positive; ki_description: 150mA, 28V LDO Regulator With Shutdown, 1.8V Fixed Output, SOT-89-3; ki_fp_filters: SOT?89*; Footprint: Package_TO_SOT_SMD:SOT-89-3; Supplier: http://ww1.microchip.com/downloads/en/DeviceDoc/20002200D.pdf
footprint SOT-89-3
pins: 1 OUT (power), 2 GND (power), 3 IN (power)

## MCP1804x-1802xMT
designator *  value MCP1804x-1802xMT
ki_keywords: linear regulator ldo fixed positive; ki_description: 150mA, 28V LDO Regulator With Shutdown, 1.8V Fixed Output, SOT-89-5; ki_fp_filters: SOT?89*; Footprint: Package_TO_SOT_SMD:SOT-89-5; Supplier: http://ww1.microchip.com/downloads/en/DeviceDoc/20002200D.pdf
footprint SOT-89-5
pins: 1 VOUT (power), 2 GND (power), 3 ~{{SHDN}} (in), 4 NC (in) hidden, 5 VIN (power)

## MCP1804x-1802xOT
designator *  value MCP1804x-1802xOT
ki_keywords: linear regulator ldo fixed positive; ki_description: 150mA, 28V LDO Regulator With Shutdown, 1.8V Fixed Output, SOT-23-5; ki_fp_filters: SOT?23*; Footprint: Package_TO_SOT_SMD:SOT-23-5; Supplier: http://ww1.microchip.com/downloads/en/DeviceDoc/20002200D.pdf
footprint SOT-23-5
pins: 1 VIN (power), 2 GND (power), 3 NC (in) hidden, 4 ~{{SHDN}} (in), 5 VOUT (power)

## MCP1804x-2502xDB
designator *  value MCP1804x-2502xDB
ki_keywords: linear regulator ldo fixed positive; ki_description: 150mA, 28V LDO Regulator With Shutdown, 2.5V Fixed Output, SOT-223; ki_fp_filters: SOT?223*; Footprint: Package_TO_SOT_SMD:SOT-223-3_TabPin2; Supplier: http://ww1.microchip.com/downloads/en/DeviceDoc/20002200D.pdf
footprint SOT-223-3_TabPin2
pins: 1 OUT (power), 2 GND (power), 3 IN (power)

## MCP1804x-2502xMB
designator *  value MCP1804x-2502xMB
ki_keywords: linear regulator ldo fixed positive; ki_description: 150mA, 28V LDO Regulator With Shutdown, 2.5V Fixed Output, SOT-89-3; ki_fp_filters: SOT?89*; Footprint: Package_TO_SOT_SMD:SOT-89-3; Supplier: http://ww1.microchip.com/downloads/en/DeviceDoc/20002200D.pdf
footprint SOT-89-3
pins: 1 OUT (power), 2 GND (power), 3 IN (power)

## MCP1804x-2502xMT
designator *  value MCP1804x-2502xMT
ki_keywords: linear regulator ldo fixed positive; ki_description: 150mA, 28V LDO Regulator With Shutdown, 2.5V Fixed Output, SOT-89-5; ki_fp_filters: SOT?89*; Footprint: Package_TO_SOT_SMD:SOT-89-5; Supplier: http://ww1.microchip.com/downloads/en/DeviceDoc/20002200D.pdf
footprint SOT-89-5
pins: 1 VOUT (power), 2 GND (power), 3 ~{{SHDN}} (in), 4 NC (in) hidden, 5 VIN (power)

## MCP1804x-2502xOT
designator *  value MCP1804x-2502xOT
ki_keywords: linear regulator ldo fixed positive; ki_description: 150mA, 28V LDO Regulator With Shutdown, 2.5V Fixed Output, SOT-23-5; ki_fp_filters: SOT?23*; Footprint: Package_TO_SOT_SMD:SOT-23-5; Supplier: http://ww1.microchip.com/downloads/en/DeviceDoc/20002200D.pdf
footprint SOT-23-5
pins: 1 VIN (power), 2 GND (power), 3 NC (in) hidden, 4 ~{{SHDN}} (in), 5 VOUT (power)

## MCP1804x-3002xDB
designator *  value MCP1804x-3002xDB
ki_keywords: linear regulator ldo fixed positive; ki_description: 150mA, 28V LDO Regulator With Shutdown, 3.0V Fixed Output, SOT-223; ki_fp_filters: SOT?223*; Footprint: Package_TO_SOT_SMD:SOT-223-3_TabPin2; Supplier: http://ww1.microchip.com/downloads/en/DeviceDoc/20002200D.pdf
footprint SOT-223-3_TabPin2
pins: 1 OUT (power), 2 GND (power), 3 IN (power)

## MCP1804x-3002xMB
designator *  value MCP1804x-3002xMB
ki_keywords: linear regulator ldo fixed positive; ki_description: 150mA, 28V LDO Regulator With Shutdown, 3.0V Fixed Output, SOT-89-3; ki_fp_filters: SOT?89*; Footprint: Package_TO_SOT_SMD:SOT-89-3; Supplier: http://ww1.microchip.com/downloads/en/DeviceDoc/20002200D.pdf
footprint SOT-89-3
pins: 1 OUT (power), 2 GND (power), 3 IN (power)

## MCP1804x-3002xMT
designator *  value MCP1804x-3002xMT
ki_keywords: linear regulator ldo fixed positive; ki_description: 150mA, 28V LDO Regulator With Shutdown, 3.0V Fixed Output, SOT-89-5; ki_fp_filters: SOT?89*; Footprint: Package_TO_SOT_SMD:SOT-89-5; Supplier: http://ww1.microchip.com/downloads/en/DeviceDoc/20002200D.pdf
footprint SOT-89-5
pins: 1 VOUT (power), 2 GND (power), 3 ~{{SHDN}} (in), 4 NC (in) hidden, 5 VIN (power)

## MCP1804x-3002xOT
designator *  value MCP1804x-3002xOT
ki_keywords: linear regulator ldo fixed positive; ki_description: 150mA, 28V LDO Regulator With Shutdown, 3.0V Fixed Output, SOT-23-5; ki_fp_filters: SOT?23*; Footprint: Package_TO_SOT_SMD:SOT-23-5; Supplier: http://ww1.microchip.com/downloads/en/DeviceDoc/20002200D.pdf
footprint SOT-23-5
pins: 1 VIN (power), 2 GND (power), 3 NC (in) hidden, 4 ~{{SHDN}} (in), 5 VOUT (power)

## MCP1804x-3302xDB
designator *  value MCP1804x-3302xDB
ki_keywords: linear regulator ldo fixed positive; ki_description: 150mA, 28V LDO Regulator With Shutdown, 3.3V Fixed Output, SOT-223; ki_fp_filters: SOT?223*; Footprint: Package_TO_SOT_SMD:SOT-223-3_TabPin2; Supplier: http://ww1.microchip.com/downloads/en/DeviceDoc/20002200D.pdf
footprint SOT-223-3_TabPin2
pins: 1 OUT (power), 2 GND (power), 3 IN (power)

## MCP1804x-3302xMB
designator *  value MCP1804x-3302xMB
ki_keywords: linear regulator ldo fixed positive; ki_description: 150mA, 28V LDO Regulator With Shutdown, 3.3V Fixed Output, SOT-89-3; ki_fp_filters: SOT?89*; Footprint: Package_TO_SOT_SMD:SOT-89-3; Supplier: http://ww1.microchip.com/downloads/en/DeviceDoc/20002200D.pdf
footprint SOT-89-3
pins: 1 OUT (power), 2 GND (power), 3 IN (power)

## MCP1804x-3302xMT
designator *  value MCP1804x-3302xMT
ki_keywords: linear regulator ldo fixed positive; ki_description: 150mA, 28V LDO Regulator With Shutdown, 3.3V Fixed Output, SOT-89-5; ki_fp_filters: SOT?89*; Footprint: Package_TO_SOT_SMD:SOT-89-5; Supplier: http://ww1.microchip.com/downloads/en/DeviceDoc/20002200D.pdf
footprint SOT-89-5
pins: 1 VOUT (power), 2 GND (power), 3 ~{{SHDN}} (in), 4 NC (in) hidden, 5 VIN (power)

## MCP1804x-3302xOT
designator *  value MCP1804x-3302xOT
ki_keywords: linear regulator ldo fixed positive; ki_description: 150mA, 28V LDO Regulator With Shutdown, 3.3V Fixed Output, SOT-23-5; ki_fp_filters: SOT?23*; Footprint: Package_TO_SOT_SMD:SOT-23-5; Supplier: http://ww1.microchip.com/downloads/en/DeviceDoc/20002200D.pdf
footprint SOT-23-5
pins: 1 VIN (power), 2 GND (power), 3 NC (in) hidden, 4 ~{{SHDN}} (in), 5 VOUT (power)

## MCP1804x-5002xDB
designator *  value MCP1804x-5002xDB
ki_keywords: linear regulator ldo fixed positive; ki_description: 150mA, 28V LDO Regulator With Shutdown, 5.0V Fixed Output, SOT-223; ki_fp_filters: SOT?223*; Footprint: Package_TO_SOT_SMD:SOT-223-3_TabPin2; Supplier: http://ww1.microchip.com/downloads/en/DeviceDoc/20002200D.pdf
footprint SOT-223-3_TabPin2
pins: 1 OUT (power), 2 GND (power), 3 IN (power)

## MCP1804x-5002xMB
designator *  value MCP1804x-5002xMB
ki_keywords: linear regulator ldo fixed positive; ki_description: 150mA, 28V LDO Regulator With Shutdown, 5.0V Fixed Output, SOT-89-3; ki_fp_filters: SOT?89*; Footprint: Package_TO_SOT_SMD:SOT-89-3; Supplier: http://ww1.microchip.com/downloads/en/DeviceDoc/20002200D.pdf
footprint SOT-89-3
pins: 1 OUT (power), 2 GND (power), 3 IN (power)